# Altium footprint library Item_pcb.PcbLib: 282 footprints (part 3 of 18)
Each footprint in its own frame and in the unit in brackets; x right, y up, seen from the top. Pads: shape width x height; smd on the part's side, far side on the other; paste and mask are expansions set on the pad; w line width, h text height; cw(c..) or ccw(c..) is an arc to the next point about the centre after c.
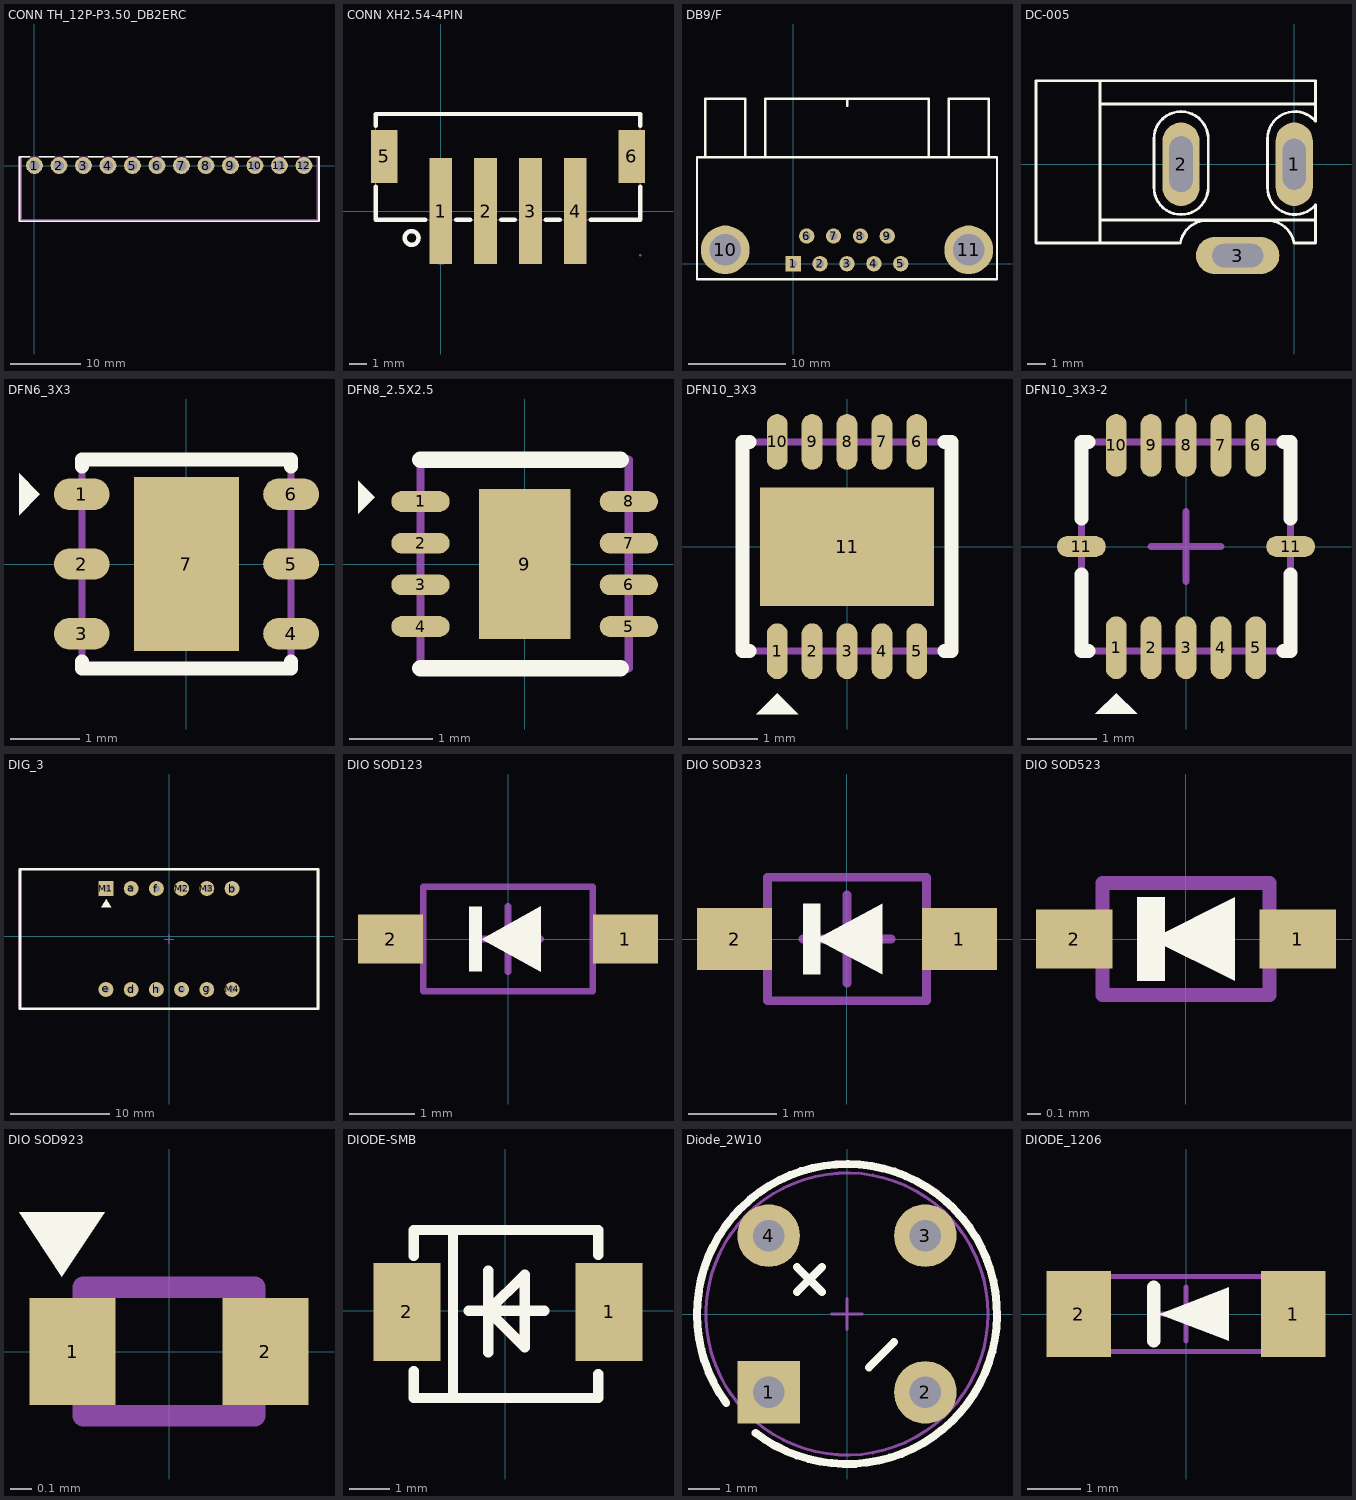
[diagram p2: the footprints below, top view; thin cyan lines are the x and y axes]

## CONN TH_12P-P3.50_DB2ERC [mm] "3.50MM"
pads (12):
  round 2.4 hole 1.5: 1(0,0) 2(3.5,0) 3(7,0) 4(10.5,0) 5(14,0) 6(17.5,0) 7(21,0) 8(24.5,0) 9(28,0) 10(31.5,0) 11(35,0) 12(38.5,0)
Top Overlay:
  lines w0.254: -0.692,1.251 -2.15,1.251 -2.15,-7.949 40.652,-7.949 40.652,1.241 ; 0.692,1.251 2.808,1.251 ; 4.192,1.251 6.308,1.251 ; 7.692,1.251 9.808,1.251 ; 11.192,1.251 13.308,1.251 ; 14.692,1.251 16.808,1.251 ; 18.192,1.251 20.308,1.251 ; 21.692,1.251 23.808,1.251 ; 25.192,1.251 27.308,1.251 ; 28.692,1.251 30.808,1.251 ; 32.192,1.251 34.308,1.251 ; 35.693,1.251 37.808,1.251 ; 39.192,1.251 40.65,1.251
Mechanical 6:
  region: -2.15,1.3 -2.15,-8 40.65,-8 40.65,1.3 40.55,1.3 40.35,1.3 40.35,-7.7 -1.85,-7.7 -1.85,1.3
Mechanical 15:
  region: -2.09,-7.949 -2.091,-7.925 -2.126,-7.891 -2.174,-7.891 -2.209,-7.925 -2.21,-7.949 -2.209,-7.973 -2.174,-8.008 -2.125,-8.007 -2.091,-7.973
  region: 38,0.5 39,0.5 39,-0.5 38,-0.5
  region: 34.5,0.5 35.5,0.5 35.5,-0.5 34.5,-0.5
  region: 31,0.5 32,0.5 32,-0.5 31,-0.5
  region: 27.5,0.5 28.5,0.5 28.5,-0.5 27.5,-0.5
  region: -0.5,0.5 0.5,0.5 0.5,-0.5 -0.5,-0.5
  region: 3,0.5 4,0.5 4,-0.5 3,-0.5
  region: 6.5,0.5 7.5,0.5 7.5,-0.5 6.5,-0.5
  region: 10,0.5 11,0.5 11,-0.5 10,-0.5
  region: 13.5,0.5 14.5,0.5 14.5,-0.5 13.5,-0.5
  region: 17,0.5 18,0.5 18,-0.5 17,-0.5
  region: 20.5,0.5 21.5,0.5 21.5,-0.5 20.5,-0.5
  region: 24,0.5 25,0.5 25,-0.5 24,-0.5
  lines w0.051: -2.15,-7.949 40.65,-7.949 40.65,0.764 40.65,1.251 -2.15,1.251 -2.15,-7.949
3D body "3D_PCB2_2024-03-27-12P-3.5MM_end.STEP": height 7.6, standoff -3.1, extent -2.121,-8 40.679,1.2

## CONN XH2.54-4PIN [mm] "2.54MM"
pads (6):
  rect 1.3x6 smd: 1(0,0) 2(2.54,0) 3(5.08,0) 4(7.62,0)
  rect 1.5x3 smd: 5(-3.19,3.1) 6(10.81,3.1)
Top Overlay:
  circle w0.254: c-1.651,-1.524 r0.39
  lines w0.254: -3.69,1.369 -3.69,-0.5 -0.881,-0.5 ; -3.69,4.831 -3.69,5.5 11.31,5.5 11.31,4.831 ; 0.881,-0.5 1.659,-0.5 ; 3.421,-0.5 4.199,-0.5 ; 5.961,-0.5 6.739,-0.5 ; 8.501,-0.5 11.31,-0.5 11.31,1.369
Mechanical 6:
  circle w0.5: c0,-2.54 r0.25
Mechanical 15:
  region: -2.89,2.23 -3.49,2.23 -3.49,4.23 -2.89,4.23
  region: 11.11,2.23 10.51,2.23 10.51,4.23 11.11,4.23
  region: 0.3,-2.5 -0.3,-2.5 -0.3,2.7 0.3,2.7
  region: 2.84,-2.5 2.24,-2.5 2.24,2.7 2.84,2.7
  region: 5.38,-2.5 4.78,-2.5 4.78,2.7 5.38,2.7
  region: 7.92,-2.5 7.32,-2.5 7.32,2.7 7.92,2.7
  region: 11.25,-2.5 11.251,-2.524 11.286,-2.559 11.335,-2.559 11.37,-2.524 11.37,-2.5 11.37,-2.476 11.335,-2.441 11.286,-2.441 11.251,-2.475
  lines w0.051: -3.69,-0.5 -3.69,5.5 11.31,5.5 11.31,-0.5 -3.69,-0.5
3D body "wenjian1.step": height 8, standoff 0, extent -3.75,-2.653 11.37,5.347

## DB9/F [mm]
pads (11):
  rect 1.575x1.575 hole 0.8: 1(0,0)
  round 1.575 hole 0.8: 2(2.76,0) 3(5.52,0) 4(8.28,0) 5(11.04,0) 6(1.38,2.84) 7(4.14,2.84) 8(6.9,2.84) 9(9.66,2.84)
  round 5 hole 3.25: 10(-6.98,1.42) 11(18.02,1.42)
Top Overlay:
  lines w0.254: -9.05,10.92 -9.05,16.92 -4.94,16.92 ; -4.91,10.92 -4.91,16.92 ; -2.85,10.92 -2.85,16.92 13.9,16.92 13.9,10.92 ; 5.525,16.2 5.525,16.9 ; 15.95,10.92 15.95,16.92 20.06,16.92 ; 20.09,10.92 20.09,16.92 ; -9.88,-1.58 20.92,-1.58 20.92,10.92 -9.88,10.92 -9.88,-1.58
3D body "SW3dPS-9-PIN_DSUB-1.STEP": height 12.81, standoff -2.91, extent -9.925,-2.012 20.885,17.063

## DC-005 [mil]
pads (3):
  oval 80x180 hole 50 slot 110 at 90 deg: 1(0,0)
  oval 80x180 hole 50 slot 120 at 90 deg: 2(-244.09,0)
  oval 180x80 hole 50 slot 110 at 0 deg: 3(-122.05,-196.85)
Top Overlay:
  lines w6: -419.09,-120 45.91,-120 ; -419.09,130 41.04,130 45.15,130 ; -414.09,180 -434.09,180 -556.89,180 -556.89,-170 -419.09,-170 ; -250.09,-170 -419.09,-170 ; -245.73,-169.84 cw(c-188.09,-180) -188.09,-121.48 -58.09,-121.48 cw(c-58.09,-180) -0.46,-169.84 ; 0.91,-170 45.91,-170 45.91,-90 ; 45.74,-87.62 cw(c0.91,-50) -57.62,-50 -57.62,55 cw(c0.91,55) 45.74,92.62 45.91,180 -419.09,180 -419.09,-170 ; -185.57,55 ccw(c-244.09,55) -302.62,55 -302.62,-50 ccw(c-244.09,-50) -185.57,-50 -185.57,55 ; -185.57,55 -185.57,55
3D body "dc-005.STEP": height 440.94, standoff -149.61, extent -550.09,-188.07 3.06,178.07

## DFN6_3X3 [mm] "0.95"
pads (7):
  oval 0.8x0.45 smd: 1(-1.5,1) 2(-1.5,0) 3(-1.5,-1) 4(1.5,-1) 5(1.5,0) 6(1.5,1)
  rect 1.5x2.5 smd: 7(0,0)
Top Overlay:
  region: -2.1,1 -2.4,1.3 -2.4,0.7
  lines w0.2: -1.5,-1.4 -1.5,-1.5 1.5,-1.5 1.5,-1.4 ; -1.5,1.4 -1.5,1.5 1.5,1.5 1.5,1.4
Mechanical 15:
  lines w0.1: -1.5,-1.5 -1.5,1.5 1.5,1.5 1.5,-1.5 -1.5,-1.5
3D body "DFN3X3-6.step": height 0.8, standoff 0, extent -1.55,-1.5 1.55,1.5

## DFN8_2.5X2.5 [mm]
pads (9):
  oval 0.7x0.25 smd: 1(-1.25,0.75) 2(-1.25,0.25) 3(-1.25,-0.25) 4(-1.25,-0.75) 5(1.25,-0.75) 6(1.25,-0.25) 7(1.25,0.25) 8(1.25,0.75)
  rect 1.1x1.8 smd: 9(0,0)
Top Overlay:
  region: -1.8,0.8 -2,1 -2,0.6
  lines w0.2: -1.25,-1.25 1.15,-1.25 ; -1.25,1.25 1.15,1.25
Mechanical 15:
  lines w0.1: -1.25,-1.25 -1.25,1.25 1.25,1.25 1.25,-1.25 -1.25,-1.25

## DFN10_3X3 [mm]
pads (11):
  oval 0.3x0.8 smd: 1(-1,-1.5) 2(-0.5,-1.5) 3(0,-1.5) 4(0.5,-1.5) 5(1,-1.5) 6(1,1.5) 7(0.5,1.5) 8(0,1.5) 9(-0.5,1.5) 10(-1,1.5)
  rect 2.5x1.7 smd: 11(0,0)
Top Overlay:
  region: -1,-2.1 -1.3,-2.4 -0.7,-2.4
  lines w0.2: -1.4,-1.5 -1.5,-1.5 -1.5,1.5 -1.4,1.5 ; 1.4,-1.5 1.5,-1.5 1.5,1.5 1.4,1.5
Mechanical 15:
  lines w0.1: -1.5,-1.5 1.5,-1.5 1.5,1.5 -1.5,1.5 -1.5,-1.5
3D body "DFN3x3-10P.STEP": height 0.8, standoff 0, extent -1.5,-1.5 1.5,1.5

## DFN10_3X3-2 [mm]
pads (12):
  oval 0.3x0.9 smd: 1(-1,-1.45) 2(-0.5,-1.45) 3(0,-1.45) 4(0.5,-1.45) 5(1,-1.45) 6(1,1.45) 7(0.5,1.45) 8(0,1.45) 9(-0.5,1.45) 10(-1,1.45)
  oval 0.7x0.3 smd: 11(-1.5,0) 11(1.5,0)
Top Overlay:
  region: -1,-2.1 -1.3,-2.4 -0.7,-2.4
  lines w0.2: -1.5,-0.4 -1.5,-1.5 -1.4,-1.5 ; -1.5,0.4 -1.5,1.5 -1.4,1.5 ; 1.4,-1.5 1.5,-1.5 1.5,-0.4 ; 1.4,1.5 1.5,1.5 1.5,0.4
Mechanical 15:
  lines w0.1: -0.5,0 0.5,0 ; 0,-0.5 0,0.5 ; -1.5,-1.5 -1.5,1.5 1.5,1.5 1.5,-1.5 -1.5,-1.5
3D body "DFN3x3-10P.STEP": height 0.8, standoff 0, extent -1.5,-1.5 1.5,1.5

## DIG_3 [mm]
pads (12):
  round 1.5 hole 0.7: a(-3.81,4.78) b(6.35,4.78) c(1.27,-5.38) d(-3.81,-5.38) e(-6.35,-5.38) f(-1.27,4.78) g(3.81,-5.38) h(-1.27,-5.38) M2(1.27,4.78) M3(3.81,4.78) M4(6.35,-5.38)
  rect 1.5x1.5 hole 0.7: M1(-6.35,4.78)
Top Overlay:
  region: -6.3,3.7 -6.8,2.9 -5.8,2.9
  lines w0.254: -15,-7.3 15,-7.3 15,6.7 -15,6.7 -15,-7.3
Mechanical 15:
  lines w0.1: -0.5,-0.3 0.5,-0.3 ; 0,-0.8 0,0.2 ; -15.1,-7.3 -15.1,6.7 15.1,6.7 15.1,-7.3 -15.1,-7.3
3D body "DISP 0.36X4.step": height 7.2, standoff -5.4, extent -15,-7.3 15,6.7

## DIO SOD123 [mm]
pads (2):
  rect 1x0.75 smd: 1(1.8,0) 2(-1.8,0)
Top Overlay:
  region: -0.4,-0.5 -0.4,0.5 -0.6,0.5 -0.6,-0.5
  region: 0.5,0.5 0.5,-0.5 -0.4,0
Mechanical 15:
  lines w0.1: -0.5,0 0.5,0 ; 0,-0.5 0,0.5 ; -1.3,-0.8 -1.3,0.8 1.3,0.8 1.3,-0.8 -1.3,-0.8
3D body "SOD123.STEP": height 1.27, standoff 0, extent -1.85,-0.8 1.85,0.8

## DIO SOD323 [mm]
pads (2):
  rect 0.85x0.7 smd: 1(1.275,0) 2(-1.275,0)
Top Overlay:
  rectangle: -0.5,-0.4 -0.3,0.4
  region: 0.4,0.4 0.4,-0.4 -0.35,0
Mechanical 15:
  lines w0.1: -0.5,0 0.5,0 ; 0,-0.5 0,0.5 ; -0.9,-0.7 -0.9,0.7 0.9,0.7 0.9,-0.7 -0.9,-0.7
3D body "SOD323.STEP": height 0.79, standoff -0.08, extent -1.35,-0.67 1.35,0.68

## DIO SOD523 [mm]
pads (2):
  rect 0.55x0.42 smd: 1(0.8,0) 2(-0.8,0)
Top Overlay:
  rectangle: -0.35,-0.3 -0.15,0.3
  region: -0.25,0 0.35,-0.3 0.35,0.3
Mechanical 15:
  lines w0.1: -0.6,-0.4 -0.6,0.4 0.6,0.4 0.6,-0.4 -0.6,-0.4
3D body "SOD523.STEP": height 0.7, standoff 0, extent -0.8,-0.4 0.8,0.398

## DIO SOD923 [mm]
pads (2):
  rect 0.4x0.5 smd: 1(-0.45,0) 2(0.45,0)
Top Overlay:
  region: -0.7,0.65 -0.3,0.65 -0.5,0.35
Mechanical 15:
  lines w0.1: -0.4,-0.3 0.4,-0.3 0.4,0.3 -0.4,0.3 -0.4,-0.3
3D body "SOD923.step": height 0.4, standoff 0, extent -0.5,-0.3 0.5,0.3

## DIODE-SMB [mm]
pads (2):
  rect 1.65x2.4 smd: 1(2.539,-0.025) 2(-2.411,-0.025)
Top Overlay:
  lines w0.254: -2.248,-1.473 -2.248,-2.134 2.273,-2.134 2.273,-1.549 ; -2.248,1.346 -2.248,1.981 2.273,1.981 2.273,1.372 ; -1.283,-2.057 -1.283,1.981 ; -0.902,0 0.953,0 ; -0.419,-1.016 -0.419,0.991 ; -0.419,0 0.47,0.889 0.47,-0.889 -0.419,0
3D body "DI-214AA(SMB).step": height 2.45, standoff 0.03, extent -2.687,-2.001 2.814,1.899

## Diode_2W10 [mm]
pads (4):
  rect 2x2 hole 1: 1(-2.5,-2.5)
  round 2 hole 1: 2(2.5,-2.5) 3(2.5,2.5) 4(-2.5,2.5)
Top Overlay:
  lines w0.254: -3.853,-2.839 cw(c0,0) -2.918,-3.793 ; -1.6,0.7 -0.8,1.5 ; -1.6,1.5 -0.8,0.7 ; 0.7,-1.7 1.5,-0.9
Mechanical 15:
  circle w0.1: c0,0 r4.5
  lines w0.1: -0.5,0 0.5,0 ; 0,-0.5 0,0.5
3D body "2W10 2A fi 9mm x 7mm.step": height 8, standoff -10, extent -4.5,-4.5 4.5,4.5

## DIODE_1206 [mm]
pads (2):
  rect 1.2x1.6 smd: 1(2.004,0) 2(-2.004,0)
Top Overlay:
  region: -0.5,0 0.8,0.5 0.8,-0.5
  lines w0.254: -0.6,-0.5 -0.6,0.5
Mechanical 15:
  lines w0.1: -0.5,0 0.5,0 ; 0,-0.5 0,0.5 ; -1.5,-0.7 1.5,-0.7 1.5,0.7 -1.5,0.7 -1.5,-0.7
3D body "DIOMELF3414N.STEP": height 1.4, standoff 0, extent -1.7,-0.7 1.7,0.7